# Altium integrated library Integrated_Library1.IntLib: 249 symbols (part 1 of 4) (continued)
## AF 90° WJDG (continued)

## AFC11-S22ICC-00
designator FPC?  (value not drawn)
22P FPC连接器; Manufacturer: JS(钜硕电子); Symbol: AFC11-S22ICC-00_C11074; Add into BOM: yes; Locking Feature: 抽屉式; Pitch: 0.5mm; FFC, FCB Thickness: 0.3mm; Device: AFC11-S22ICC-00; LCSC Part Name: 间距:0.5mm P数:22P 抽屉式 单侧触点/垂直; Supplier Part: C11074; Manufacturer Part: AFC11-S22ICC-00; Supplier Footprint: SMD,P=0.5mm; JLCPCB Part Class: Extended Part; Datasheet: https://atta.szlcsc.com/upload/public/pdf/source/20191211/C466537_F6F2472ADACFFA77E875AFE9DAB8E0AD.pdf; Supplier: LCSC; Convert to PCB: yes; Contact Type: 单侧触点/垂直; Number of Contacts: 22P; Mounting Type: 立贴; Height Above Board: 4.4mm
footprint FPC-SMD_22P-P1.00_AFC11-S22ICC-00
3D model FPC-SMD_22P-P1.00_AFC11-S22ICC-00
pins: 1, 2, 3, 4, 5, 6, 7, 8, 9, 10, 11, 12, 13, 14, 15, 16, 17, 18, 19, 20, 21, 22, 23, 24

## AMS1117-3.3
designator U?
线性稳压芯片; PartNumber: LM1117IDT-3.3; Manufacturer: National Semiconductor; PackageTopMarking: NSUZXYTT*LM1117*IDT-3.3; PowerWise: N; CompType: LDO IC; High-Reliability: Y; DatasheetVersion: Apr-2006; PackageVersion: revD, Feb-2009; PackageReference: TD03B; PackageDescription: TO252, Molded, Jedec, 6.8 x 6.10 x 2.30mm Body, 3 Lead, 2.28mm Pitch, Surface Mount; RoHS: N; PinCount: 3; Code_JEDEC: TO-252-AA; ComponentLink1Description: Manufacturer URL; ComponentLink1URL: http://www.national.com/; ComponentLink2Description: LM1117 Datasheet; ComponentLink2URL: http://www.national.com/ds/LM/LM1117.pdf; ComponentLink3Description: LM1117 Web Page; ComponentLink3URL: http://www.national.com/pf/LM/LM1117.html; ComponentLink4Description: TD03B Package Page; ComponentLink4URL: http://www.national.com/packaging/folders/td03b.html
footprint sot-223
pins: 1 GND (power), 2 OUT (power), 3 IN (power)

## ANT3216LL00R2400A
designator U?  (value not drawn)
2.4GHz天线; Manufacturer: YAGEO(国巨); Add into BOM: yes; Antenna Type: 芯片天线; Central Frequency: 2.45GHz; Bandwidth: 160MHz; Peak Gain: 5.05dBi; Polarization Type: 线性; Impedance: 50Ω; Power capacity: 1W; Symbol: ANT3216LL00R2400A; Device: ANT3216LL00R2400A; LCSC Part Name: 无线组件陶瓷芯片天线; Supplier Part: C293767; Manufacturer Part: ANT3216LL00R2400A; Supplier Footprint: 1206; JLCPCB Part Class: Extended Part; Datasheet: https://atta.szlcsc.com/upload/public/pdf/source/20181012/C293767_CDE82A2F74DC82A94DB708CB53B68F23.pdf; Supplier: LCSC; Convert to PCB: yes; VSWR: -; Operating Temperature: -40℃~+105℃
footprint ANT-SMD_L3.2-W1.6
3D model ANT-SMD_L3.2-W1.6-H1.3
pins: 1, 2

## AON7403
designator U?  (value not drawn)
Manufacturer: TECH PUBLIC(台舟); Symbol: AON7403_C5310961; Add into BOM: yes; Device: AON7403_C5310961; LCSC Part Name: AON7403; Supplier Part: C5310961; Manufacturer Part: AON7403; Supplier Footprint: PDFN-8; JLCPCB Part Class: Extended Part; Datasheet: https://atta.szlcsc.com/upload/public/pdf/source/20221212/36DA98EDFE73327CB4574501A775E746.pdf; Supplier: LCSC; Convert to PCB: yes
footprint DFN-8_L3.0-W3.0-P0.65-BL
pins: D, G, S

## BAT46WJ
designator D?, comment BAT46WJ,115  (value not drawn)
小信号肖特基二极管; Manufacturer: Nexperia(安世); Add into BOM: yes; Forward Voltage (Vf@If): 850mV@250mA; Reverse Voltage (Vr): 100V; Average Rectified Current (Io): 250mA; Reverse Leakage Current (Ir): 9uA@100V; Symbol: BAT46WJ,115; Device: BAT46WJ,115; LCSC Part Name: 电压:100V 电流:250mA; Supplier Part: C114696; Manufacturer Part: BAT46WJ,115; Supplier Footprint: SOD-323F; JLCPCB Part Class: Extended Part; Datasheet: https://atta.szlcsc.com/upload/public/pdf/source/20170620/1497944776306.pdf; Supplier: LCSC; Convert to PCB: yes
footprint SOD-323F_L2.0-W1.6-LS2.5-RD
3D model SOD-323F_L1.6-W1.3-H1.1-LS2.7
pins: 1 K, 2 A

## BC807-25
designator Q?  (value not drawn)
PNP三极管 45V; Manufacturer: Slkor(萨科微); Symbol: BC807-25_C556162; Add into BOM: yes; Transistor Type: PNP; Collector Current (Ic): 500mA; Power Dissipation (Pd): 300mW; DC Current Gain (hFE@Ic,Vce): 160@100mA,1V; Transition Frequency (fT): 100MHz; Collector Cut-Off Current (Icbo): 100nA; Collector-Emitter Saturation Voltage (VCE(sat)@Ic,Ib): 700mV@500mA,50mA; Device: BC807-25_C556162; LCSC Part Name: PNP 电流:500mA 耐压:45V; Supplier Part: C556162; Manufacturer Part: BC807-25; Supplier Footprint: SOT-23; JLCPCB Part Class: Extended Part; Datasheet: https://atta.szlcsc.com/upload/public/pdf/source/20200521/C556162_BDCBBA5B0FE68DCC5A46121101641694.pdf; Supplier: LCSC; Convert to PCB: yes; Collector-Emitter Breakdown Voltage (Vceo): 45V; Operating Temperature: -
footprint SOT-23-3_L2.9-W1.3-P1.90-LS2.4-BR
pins: 1 B, 2 E, 3 C

## BL-M8800DS1
designator U?  (value not drawn)
WIFI6 2.4GHz/5GHz模块; Manufacturer: Ai-Thinker(安信可); Symbol: AI-M62-CBS(BLIFN4); Add into BOM: yes; Device: Ai-M62-CBS(BLIFN4); LCSC Part Name: Ai-M62-CBS(BLIFN4); Supplier Part: C41368035; Manufacturer Part: Ai-M62-CBS(BLIFN4); Supplier Footprint: SMD,12x12mm; JLCPCB Part Class: Extended Part; Datasheet: https://atta.szlcsc.com/upload/public/pdf/source/20240321/D62C7EC8BED5F5764FD8187C205F7E1C.pdf; Supplier: LCSC; Convert to PCB: yes
footprint WIRELM-SMD_AI-M62-CBS
3D model WIRELM-SMD_AI-M62-CBS
pins: 1 GND, 2 WL_BT_ANT, 3 GND, 4 NC, 5 GND, 6 HOST_WAKE_BT, 7 BT_WAKE_HOST, 8 NC, 9 VBAT, 10 USB_DM, 11 USB_DP, 12 WL_PWR, 13 WL_WAKE_HOST, 14 SDIO_DATA_2, 15 SDIO_DATA_3, 16 SDIO_CMD, 17 SDIO_CLK, 18 SDIO_DATA_0, 19 SDIO_DATA_1, 20 GND, 21 NC, 22 VDDIO, 23 GPIO_B4, 24 NC, 25 NC, 26 NC, 27 NC, 28 NC, 29 UART0_TX, 30 UART0_RX, 31 GND, 32 NC, 33 GND, 34 GPIOB7, 35 GPIOB6, 36 GND, 37 NC, 38 NC, 39 NC, 40 NC, 41 UART1_RTS, 42 UART1_TX, 43 UART1_RX, 44 UART1_CTS

## BMI088
designator U5
BMI088 陀螺仪
footprint LGA-16_L4.5-W3.0-P0.50-BL
pins: 1 INT2, 2 NC, 3 VDD, 4 GNDIO, 5 CSB2, 6 GND, 7 PS, 8 SCK, 9 SDI, 10 SDO2, 11 VDDIO, 12 INT3, 13 INT4, 14 CSB1, 15 SDO1, 16 INT1

## BZT52C27S
designator D?  (value not drawn)
Manufacturer: YFW(佑风微); Symbol: BZT52C27S_C5270783; Add into BOM: yes; Diode Configuration: 独立式; Zener Voltage (Nom): 25.1V; Reverse Leakage Current (Ir): 100nA@18.9V; Zener Voltage (Range): 27V~28.9V; Power Dissipation: 200mW; Zener Impedance (Zzt): 80Ω; Device: BZT52C27S_C5270783; LCSC Part Name: BZT52C27S; Supplier Part: C5270783; Manufacturer Part: BZT52C27S; Supplier Footprint: SOD-323; JLCPCB Part Class: Extended Part; Datasheet: https://atta.szlcsc.com/upload/public/pdf/source/20221116/07630275E16F5BD1867C326257346985.pdf; Supplier: LCSC; Convert to PCB: yes
footprint SOD-323_L1.6-W1.3-LS2.7-RD
3D model SOD-323_L1.6-W1.3-LS2.7-RD
pins: 1 C, 2 A

## CD43功率电感
designator L?, comment 10uH  (value not drawn)
功率电感; Manufacturer: MINGSTAR(登壹); Name: 22uH; Symbol: CD43N-220M; Add into BOM: yes; Value: 22uH; Tolerance: ±20%; Rated Current: 930mA; DC Resistance (DCR): 230mΩ; Device: CD43N-220M; LCSC Part Name: 22uH ±20%; Supplier Part: C2832086; Manufacturer Part: CD43N-220M; Supplier Footprint: SMD,4.5x4mm; JLCPCB Part Class: Extended Part; Datasheet: https://atta.szlcsc.com/upload/public/pdf/source/20210524/C2832086_3DE1D5B4C4DE81ED72BC30D5D3934BF5.pdf; Supplier: LCSC; Convert to PCB: yes; Saturation Current (Isat): -; Ratings: -
footprint IND-SMD_L4.5-W4.0
3D model IND-SMD_L4.5-W4.0-H3.2
pins: 1, 2

## CD54功率电感
designator L?, comment 22uH
功率电感; Code_IEC: 1005; Value: 47uH; Published: 8-Jun-2000; LatestRevisionDate: 29-May-2009; LatestRevisionNote: IPC-7351 Footprint Added.; PackageReference: 0402-A; Publisher: Altium Limited; PackageDescription: Chip Inductor; Code_JEITA: 0402
footprint CD54NP
pins: 1, 2

## CD4017BM(LX)
designator U?  (value not drawn)
Manufacturer: LX(灵星芯微); Add into BOM: yes; Logic Type: 十进制计数器; Direction: 向上计数器; Supply Voltage: 3V~15V; Number of Elements: 1; Trigger Type: 上升沿; Reset Style: 异步; Timing mode: 同步; Count Rate: 11MHz; Symbol: CD4017BM(LX); Device: CD4017BM(LX); LCSC Part Name: 计数器/分频器; Supplier Part: C22390236; Manufacturer Part: CD4017BM(LX); Supplier Footprint: SOP-16; JLCPCB Part Class: Extended Part; Datasheet: https://atta.szlcsc.com/upload/public/pdf/source/20240425/31B242B6AF6C26D668B5196FBFBA2015.pdf; Supplier: LCSC; Convert to PCB: yes; Operating Temperature: -40℃~+85℃
footprint SOP-16_L10.0-W3.9-P1.27-LS6.0-BL
3D model SOP-16_L9.9-W3.9-H1.5-LS6.0-P1.27
pins: 1 Q5, 2 Q1, 3 Q0, 4 Q2, 5 Q6, 6 Q7, 7 Q3, 8 VSS, 9 Q8, 10 Q4, 11 Q9, 12 Q5-9#, 13 CP1#, 14 CP0, 15 MR, 16 VDD

## CD4017BM(LX)_1
designator U?, comment CD4017BM(LX)  (value not drawn)
Manufacturer: LX(灵星芯微); Add into BOM: yes; Logic Type: 十进制计数器; Direction: 向上计数器; Supply Voltage: 3V~15V; Number of Elements: 1; Trigger Type: 上升沿; Reset Style: 异步; Timing mode: 同步; Count Rate: 11MHz; Symbol: CD4017BM(LX); Device: CD4017BM(LX); LCSC Part Name: 计数器/分频器; Supplier Part: C22390236; Manufacturer Part: CD4017BM(LX); Supplier Footprint: SOP-16; JLCPCB Part Class: Extended Part; Datasheet: https://atta.szlcsc.com/upload/public/pdf/source/20240425/31B242B6AF6C26D668B5196FBFBA2015.pdf; Supplier: LCSC; Convert to PCB: yes; Operating Temperature: -40℃~+85℃
footprint SOP-16_L10.0-W3.9-P1.27-LS6.0-BL
3D model SOP-16_L9.9-W3.9-H1.5-LS6.0-P1.27
pins: 1 Q5, 2 Q1, 3 Q0, 4 Q2, 5 Q6, 6 Q7, 7 Q3, 8 VSS, 9 Q8, 10 Q4, 11 Q9, 12 Q5-9#, 13 CP1#, 14 CP0, 15 MR, 16 VDD

## CD4017BM(LX)_2
designator U?, comment CD4017BM(LX)  (value not drawn)
Manufacturer: LX(灵星芯微); Add into BOM: yes; Logic Type: 十进制计数器; Direction: 向上计数器; Supply Voltage: 3V~15V; Number of Elements: 1; Trigger Type: 上升沿; Reset Style: 异步; Timing mode: 同步; Count Rate: 11MHz; Symbol: CD4017BM(LX); Device: CD4017BM(LX); LCSC Part Name: 计数器/分频器; Supplier Part: C22390236; Manufacturer Part: CD4017BM(LX); Supplier Footprint: SOP-16; JLCPCB Part Class: Extended Part; Datasheet: https://atta.szlcsc.com/upload/public/pdf/source/20240425/31B242B6AF6C26D668B5196FBFBA2015.pdf; Supplier: LCSC; Convert to PCB: yes; Operating Temperature: -40℃~+85℃
footprint SOP-16_L10.0-W3.9-P1.27-LS6.0-BL
3D model SOP-16_L9.9-W3.9-H1.5-LS6.0-P1.27
pins: 1 Q5, 2 Q1, 3 Q0, 4 Q2, 5 Q6, 6 Q7, 7 Q3, 8 VSS, 9 Q8, 10 Q4, 11 Q9, 12 Q5-9#, 13 CP1#, 14 CP0, 15 MR, 16 VDD

## CD4046BM/TR
designator U?  (value not drawn)
Manufacturer: HGSEMI(华冠); Add into BOM: yes; Symbol: CD4046BM/TR; Device: CD4046BM/TR; LCSC Part Name: CD4046BM/TR; Supplier Part: C7432285; Manufacturer Part: CD4046BM/TR; Supplier Footprint: SOP-16; JLCPCB Part Class: Extended Part; Datasheet: https://atta.szlcsc.com/upload/public/pdf/source/20240403/A740F569B8D8773AFE9FBF7376F8B764.pdf; Supplier: LCSC; Convert to PCB: yes
footprint SOP-16_L9.9-W3.9-P1.27-LS6.0-BL
3D model SOP-16_L9.9-W3.9-P1.27-LS6.0-BL
pins: 1 PCP, 2 PC1, 3 COMP IN, 4 FOUT, 5 EN#, 6 C1, 7 C2, 8 VSS, 9 VCO IN, 10 SF OUT, 11 R1, 12 R2, 13 PC2, 14 SIG IN, 15 ZENER, 16 VDD

## CD4082 (LX)
designator U?
双通道四输入与门
footprint SOP14_N (8.7*6.2*1.8mm（长宽高）)
part A pins: 1, 2, 3, 4, 5, 7 VSS, 14 VCC
part B pins: 9, 10, 11, 12, 13

## CH217K
designator U?
Current-Limited USB Power Distribution Switch
footprint SOT-23-6
pins: 1 VOUT (power), 2 GND (power), 3 FLAG# (oc), 4 EN# (in), 5 ISET (io), 6 VIN (power)

## CH339F
designator U?
4 ports High-Speed USB MTT Hub with SDIO & ethernet
footprint QFN32_4X4
pins: 0 GND (power), 1 MDITP (io), 2 MDITN (io), 3 VDD33 (power), 4 MDIRP (io), 5 MDIRN (io), 6 DMU (io), 7 DPU (io), 8 XO (out), 9 XI (in), 10 AVDDK (power), 11 DM1 (io), 12 DP1 (io), 13 DM2 (io), 14 DP2 (io), 15 VDD33 (power), 16 RESET# (in), 17 OVCUR# (in), 18 PWREN# (out), 19 SD_D3 (io), 20 SD_D2 (io), 21 SD_D1 (io), 22 SD_D0 (io), 23 SD_SCK/CFG1 (io), 24 VSDIO (power), 25 SD_CMD/CFG0 (io), 26 LED_ACT/SDA (io), 27 LED_LINK/SCL (out), 28 DVDDK (power), 29 DM4 (io), 30 DP4 (io), 31 DM3 (io), 32 DP3 (io)
2 alternate drawings of the same symbol

## CH343P
designator U?
USB to high speed enhanced TTL Serial / UART
footprint QFN16_3X3 (Footprint not found)
pins: 0 GND (power), 1 VIO (power), 2 GND (power), 3 VDD5 (power), 4 TXD (out), 5 RXD (in), 6 V3 (power), 7 UD+ (io), 8 UD- (io), 9 VBUS (in), 10 ACT# (out), 11 DCD (in), 12 DTR (out), 13 RTS (out), 14 DSR (in), 15 CTS (in), 16 RI (in)

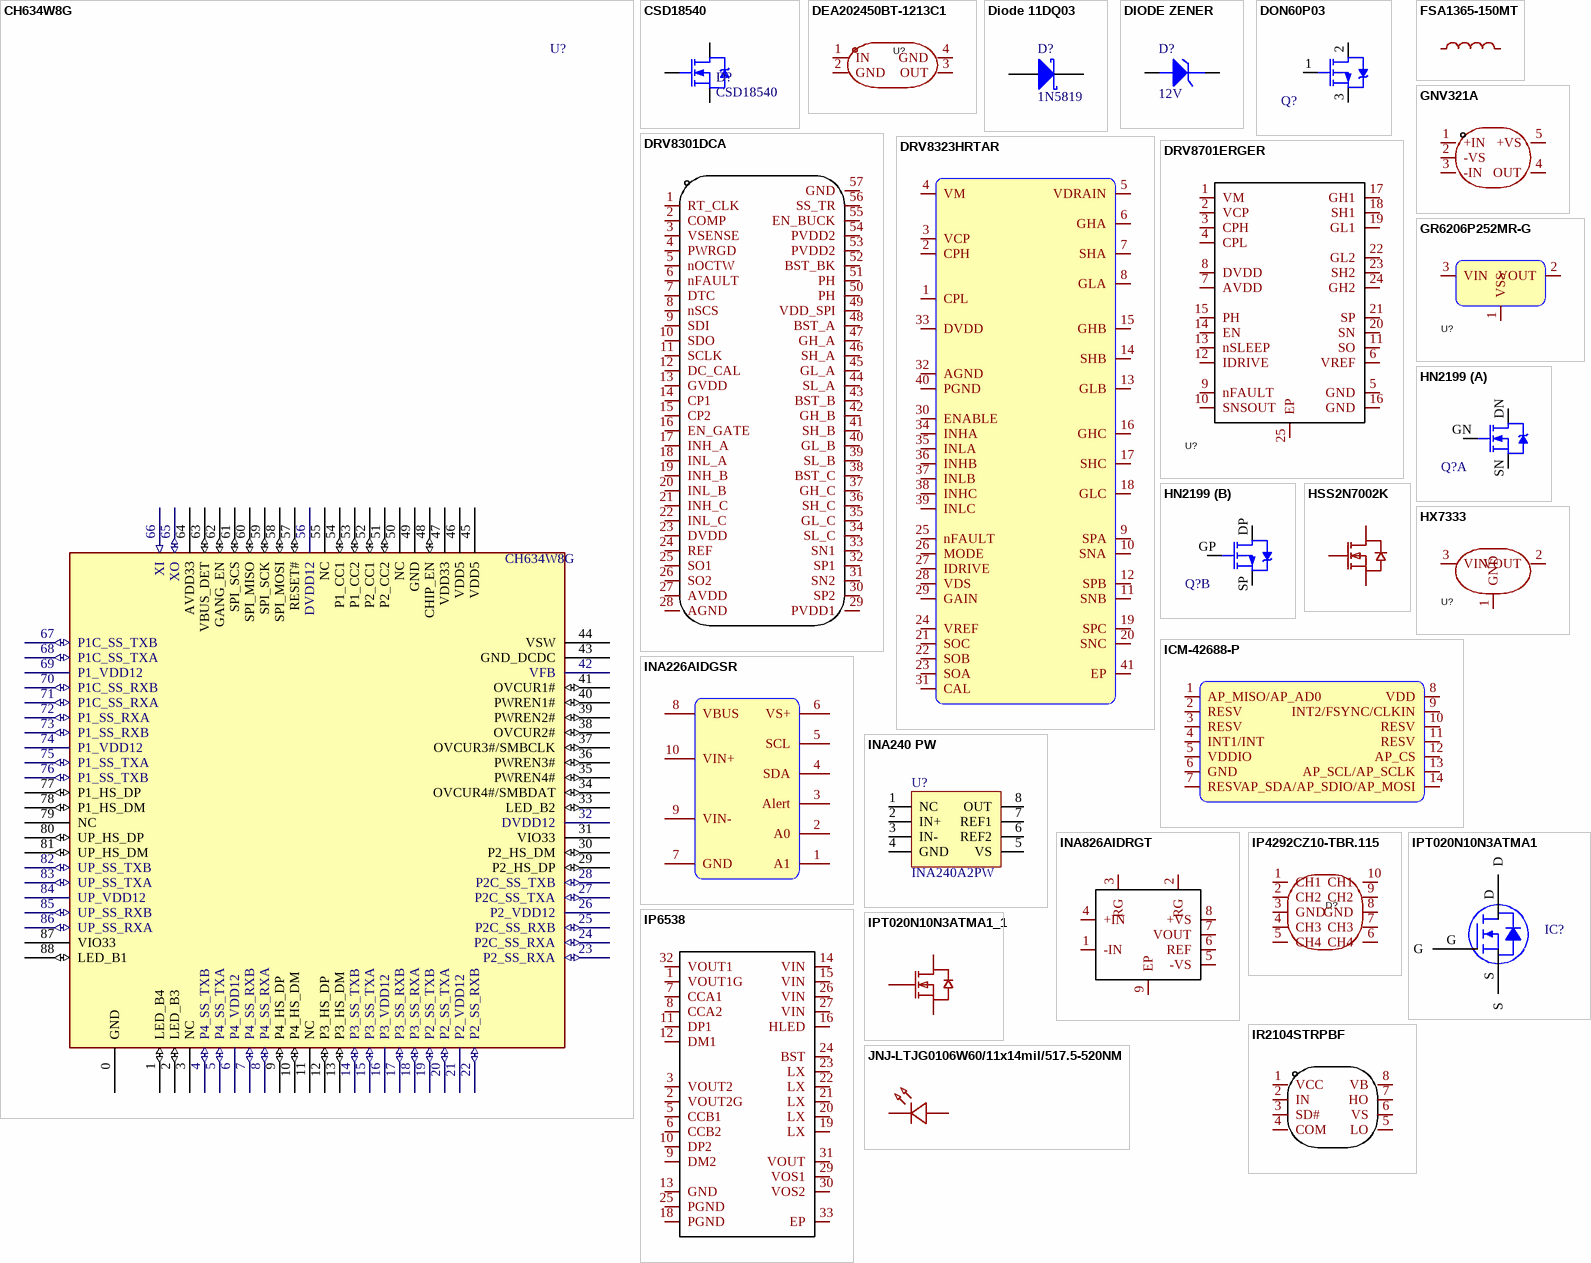
[diagram p2: symbols CH634W8G to JNJ-LTJG0106W60/11x14mil/517.5-520NM]

## CH634W8G
designator U?
4 ports USB 3.0 SS hub
footprint QFN88_10X10
pins: 0 GND (power), 1 LED_B4 (io), 2 LED_B3 (io), 3 NC, 4 P4_SS_TXB (io), 5 P4_SS_TXA (io), 6 P4_VDD12 (power), 7 P4_SS_RXB (io), 8 P4_SS_RXA (io), 9 P4_HS_DP (io), 10 P4_HS_DM (io), 11 NC, 12 P3_HS_DP (io), 13 P3_HS_DM (io), 14 P3_SS_TXB (io), 15 P3_SS_TXA (io), 16 P3_VDD12 (power), 17 P3_SS_RXB (io), 18 P3_SS_RXA (io), 19 P2_SS_TXB (io), 20 P2_SS_TXA (io), 21 P2_VDD12 (power), 22 P2_SS_RXB (io), 23 P2_SS_RXA (io), 24 P2C_SS_RXA (io), 25 P2C_SS_RXB (io), 26 P2_VDD12 (power), 27 P2C_SS_TXA (io), 28 P2C_SS_TXB (io), 29 P2_HS_DP (io), 30 P2_HS_DM (io), 31 VIO33 (power), 32 DVDD12 (power), 33 LED_B2 (io), 34 OVCUR4#/SMBDAT (io), 35 PWREN4# (io), 36 PWREN3# (io), 37 OVCUR3#/SMBCLK (io), 38 OVCUR2# (io), 39 PWREN2# (io), 40 PWREN1# (io), 41 OVCUR1# (io), 42 VFB (power), 43 GND_DCDC (power), 44 VSW (power), 45 VDD5 (power), 46 VDD5 (power), 47 VDD33 (power), 48 CHIP_EN (io), 49 GND (power), 50 NC, 51 P2_CC2 (io), 52 P2_CC1 (io), 53 P1_CC2 (io), 54 P1_CC1 (io), 55 NC, 56 DVDD12 (power), 57 RESET# (io), 58 SPI_MOSI (io), 59 SPI_SCK (io), 60 SPI_MISO (io), 61 SPI_SCS (io), 62 GANG_EN (io), 63 VBUS_DET (io), 64 AVDD33 (power), 65 XO (io), 66 XI (in), 67 P1C_SS_TXB (io), 68 P1C_SS_TXA (io), 69 P1_VDD12 (power), 70 P1C_SS_RXB (io), 71 P1C_SS_RXA (io), 72 P1_SS_RXA (io), 73 P1_SS_RXB (io), 74 P1_VDD12 (power), 75 P1_SS_TXA (io), 76 P1_SS_TXB (io), 77 P1_HS_DP (io), 78 P1_HS_DM (io), 79 NC, 80 UP_HS_DP (io), 81 UP_HS_DM (io), 82 UP_SS_TXB (io), 83 UP_SS_TXA (io), 84 UP_VDD12 (power), 85 UP_SS_RXB (io), 86 UP_SS_RXA (io), 87 VIO33 (power), 88 LED_B1 (io)

## CSD18540
designator D?
N沟道MOS管; Note: Pin 2 is electrically connected to pin 4.; Published: 8-Jun-2000; LatestRevisionDate: 17-Jul-2002; LatestRevisionNote: Re-released for DXP Platform.; DatasheetVersion: PD-9.814; PackageVersion: Feb-1997; PackageReference: TO-220AB; Publisher: Altium Limited; PackageDescription: TO, Thru-Hole, Vertical, Heatsink Mounted; 3 In-Line Leads; Pitch 2.54 mm; ComponentLink1Description: Manufacturer Link; ComponentLink1URL: http://www.irf.com/
footprint pg-tdson-8
pins: 1 G, 2 D, 3 S

## DEA202450BT-1213C1
designator U?  (value not drawn)
RF滤波器,中心频率2.45GHz,带宽100MHz; Manufacturer: TDK; Add into BOM: yes; Bandwidth: 100MHz; Filter Type: 带通; Insertion Loss: 1.5dB; Symbol: DEA202450BT-1213C1; Device: DEA202450BT-1213C1; LCSC Part Name: 多层带通滤波器; Supplier Part: C307898; Manufacturer Part: DEA202450BT-1213C1; Supplier Footprint: SMD-4P,1.2x2mm; JLCPCB Part Class: Extended Part; Datasheet: https://atta.szlcsc.com/upload/public/pdf/source/20181022/C307898_ED335916B8BBF018B2A2B9FCE924371D.pdf; Supplier: LCSC; Convert to PCB: yes; Ripple: -; Operating Temperature: -40℃~+85℃
footprint FILTER-SMD_0805-4P-L2.0-W1.3-L
3D model FILTER-SMD_0805-4P-L2.0-W1.3-H1.0-L
pins: 1 IN, 2 GND, 3 OUT, 4 GND

## Diode 11DQ03
designator D?, comment 1N5819
TVS; ComponentLink1Description: Manufacturer Link; ComponentLink1URL: http://www.irf.com/; ComponentLink2Description: Datasheet; ComponentLink2URL: http://www.irf.com/product-info/datasheets/data/11dq03.pdf
footprint SMA; pin to pad A>1 K>2
pins: 1 A, 2 K

## DIODE ZENER
designator D?, comment 12V
稳压二极管
footprint SOD-123; pin to pad A>1 K>2
pins: A, K

## DON60P03
designator Q?  (value not drawn)
PMOS 30V 60A
footprint PG-TDSON-8
pins: 1, 2, 3

## DRV8301DCA
designator U?  (value not drawn)
三相电机驱动器; Manufacturer: TI(德州仪器); Add into BOM: yes; Symbol: DRV8301DCA; Device: DRV8301DCA; Supplier: LCSC; Supplier Part: C92113; Manufacturer Part: DRV8301DCA; JLCPCB Part Class: Extended Part; LCSC Part Name: DRV8301DCA; Supplier Footprint: HTSSOP-56-EP-6mm; Datasheet: https://www.ti.com/cn/lit/gpn/drv8301; Convert to PCB: yes
footprint HTSSOP-56_L14.0-W6.0-P0.50-LS8.1-BL-EP
pins: 1 RT_CLK, 2 COMP, 3 VSENSE, 4 PWRGD, 5 nOCTW, 6 nFAULT, 7 DTC, 8 nSCS, 9 SDI, 10 SDO, 11 SCLK, 12 DC_CAL, 13 GVDD, 14 CP1, 15 CP2, 16 EN_GATE, 17 INH_A, 18 INL_A, 19 INH_B, 20 INL_B, 21 INH_C, 22 INL_C, 23 DVDD, 24 REF, 25 SO1, 26 SO2, 27 AVDD, 28 AGND, 29 PVDD1, 30 SP2, 31 SN2, 32 SP1, 33 SN1, 34 SL_C, 35 GL_C, 36 SH_C, 37 GH_C, 38 BST_C, 39 SL_B, 40 GL_B, 41 SH_B, 42 GH_B, 43 BST_B, 44 SL_A, 45 GL_A, 46 SH_A, 47 GH_A, 48 BST_A, 49 VDD_SPI, 50 PH, 51 PH, 52 BST_BK, 53 PVDD2, 54 PVDD2, 55 EN_BUCK, 56 SS_TR, 57 GND

## DRV8323HRTAR
designator U?  (value not drawn)
Manufacturer: TI(德州仪器); Add into BOM: yes; Symbol: DRV8323HRTAR; Device: DRV8323HRTAR; LCSC Part Name: 5mA 无刷直流BLDC电机驱动芯片 60V; Supplier Part: C701783; Manufacturer Part: DRV8323HRTAR; Supplier Footprint: QFN-40-EP(6x6); JLCPCB Part Class: Extended Part; Datasheet: https://www.ti.com/cn/lit/gpn/drv8323; Supplier: LCSC; Convert to PCB: yes
footprint QFN-40_L6.0-W6.0-P0.50-BL-EP4.5
3D model QFN-40_L6.0-W6.0-H0.8-P0.50
pins: 1 CPL, 2 CPH, 3 VCP, 4 VM, 5 VDRAIN, 6 GHA, 7 SHA, 8 GLA, 9 SPA, 10 SNA, 11 SNB, 12 SPB, 13 GLB, 14 SHB, 15 GHB, 16 GHC, 17 SHC, 18 GLC, 19 SPC, 20 SNC, 21 SOC, 22 SOB, 23 SOA, 24 VREF, 25 nFAULT, 26 MODE, 27 IDRIVE, 28 VDS, 29 GAIN, 30 ENABLE, 31 CAL, 32 AGND, 33 DVDD, 34 INHA, 35 INLA, 36 INHB, 37 INLB, 38 INHC, 39 INLC, 40 PGND, 41 EP

## DRV8701ERGER
designator U?  (value not drawn)
Manufacturer: TI(德州仪器); Add into BOM: yes; Symbol: DRV8701ERGER; Device: DRV8701ERGER; LCSC Part Name: 有刷直流电机驱动芯片 45V; Supplier Part: C90964; Manufacturer Part: DRV8701ERGER; Supplier Footprint: VQFN-24-EP(4x4); JLCPCB Part Class: Extended Part; Datasheet: https://www.ti.com/cn/lit/gpn/drv8701; Supplier: LCSC; Convert to PCB: yes
footprint VQFN-24_L4.0-W4.0-P0.50-TL-EP2.5
pins: 1 VM, 2 VCP, 3 CPH, 4 CPL, 5 GND, 6 VREF, 7 AVDD, 8 DVDD, 9 nFAULT, 10 SNSOUT, 11 SO, 12 IDRIVE, 13 nSLEEP, 14 EN, 15 PH, 16 GND, 17 GH1, 18 SH1, 19 GL1, 20 SN, 21 SP, 22 GL2, 23 SH2, 24 GH2, 25 EP

## FSA1365-150MT
designator L?, comment 15uH  (value not drawn)
Manufacturer: Magnetsyc(元磁); Symbol: FSA1365-150MT; Add into BOM: yes; Tolerance: ±20%; Current Rating: 9.5A; Current - Saturation(Isat): 11A; DC Resistance(DCR): 26mΩ; Type: 一体成型电感; Device: FSA1365-150MT; LCSC Part Name: FSA1365-150MT; Supplier Part: C41384379; Manufacturer Part: FSA1365-150MT; Supplier Footprint: SMD,13.5x12.6mm; Datasheet: https://atta.szlcsc.com/upload/public/pdf/source/20240711/9B03E5065F7E305B3C101DF3C90F5A28.pdf; Supplier: LCSC; Convert to PCB: yes; Value: 15uH
footprint IND-SMD_L13.8-W12.7
3D model IND-SMD_L13.8-W12.7
pins: 1, 2

## GNV321A
designator U?  (value not drawn)
Manufacturer: GN(旌芯半导体); Add into BOM: yes; Number of Channels: 单路; Maximum Power Supply Range (Vdd-Vss): 5.5V; Rail to Rail: 轨到轨输入,轨到轨输出; Gain Bandwidth Product: 1.1MHz; Vos - Input Offset Voltage: 1.5mV; Input Offset Voltage Drift(Vos TC): 2.7uV/℃; Slew Rate: 500V/ms; Noise density(eN): 20nV/√Hz@10kHz; Common Mode Rejection Ratio(CMRR): 70dB; Symbol: GNV321A; Device: GNV321A; LCSC Part Name: 单路低功耗运算放大器; Supplier Part: C22461433; Manufacturer Part: GNV321A; Supplier Footprint: SOT-23-5; JLCPCB Part Class: Extended Part; Datasheet: https://atta.szlcsc.com/upload/public/pdf/source/20240605/13659089AF980DB40762016B243D645A.pdf; Supplier: LCSC; Convert to PCB: yes; Operating Temperature: -40℃~+85℃
footprint SOT-23-5_L3.0-W1.7-P0.95-LS2.8-BR
pins: 1 +IN, 2 -VS, 3 -IN, 4 OUT, 5 +VS

## GR6206P252MR-G
designator U?  (value not drawn)
1.8V LDO,100mA; Manufacturer: GR(国睿); Add into BOM: yes; Output Type: 固定; Maximum Input Voltage: 6.5V; Output Voltage: 2.5V; Output Current: 300mA; standby current: 6.5uA; Number of Outputs: 1; Symbol: GR6206P252MR-G; Device: GR6206P252MR-G; LCSC Part Name: GR6206P252MR-G; Supplier Part: C19631733; Manufacturer Part: GR6206P252MR-G; Supplier Footprint: SOT-23-3; JLCPCB Part Class: Extended Part; Datasheet: https://atta.szlcsc.com/upload/public/pdf/source/20231222/0B414D75AEC2848EE9DFF2A875D3E7D2.pdf; Supplier: LCSC; Convert to PCB: yes; Feature: 短路保护；过流保护(OCP)；带使能
footprint SOT-23-3_L2.9-W1.6-P1.90-LS2.8-BR
3D model SOT-23-3L_L2.9-W1.6-H1.1-LS2.8-P0.95
pins: 1 VSS, 2 VOUT, 3 VIN

## HN2199
designator Q?  (value not drawn)
一个NMOS+一个PMOS
footprint DFN-8_L5.8-W4.9-P1.27-LS6.0-BL
part A pins: DN D, GN, SN S
part B pins: DP D, GP G, SP

## HSS2N7002K
designator Q?  (value not drawn)
Manufacturer: HUASHUO(华朔); Add into BOM: yes; Type: 1个N沟道; Drain to Source Voltage: 60V; Current - Continuous Drain(Id): 300mA; RDS(on): 2Ω@4.5V,100mA; Pd - Power Dissipation: 350mW; Gate Threshold Voltage (Vgs(th)@Id): 1.2V; Gate Charge(Qg): 1nC@4.5V; Input Capacitance(Ciss@Vds): 38pF@25V; Reverse Transfer Capacitance (Crss@Vds): 2pF@25V; Symbol: HSS2N7002K; Device: HSS2N7002K; LCSC Part Name: 1个N沟道 耐压:60V 电流:300mA; Supplier Part: C518788; Manufacturer Part: HSS2N7002K; Supplier Footprint: SOT-23-3; JLCPCB Part Class: Extended Part; Datasheet: https://atta.szlcsc.com/upload/public/pdf/source/20200421/C518788_C4C427C6EC2B9797F477B23308332542.pdf; Supplier: LCSC; Convert to PCB: yes; Operating Temperature: -40℃~+150℃
footprint SOT-23-3_L2.9-W1.3-P1.90-LS2.4-BR
3D model SOT-23-3P_L2.9-W1.3-H1.0-LS2.4-P0.95
pins: 1 G, 2 S, 3 D

## HX7333
designator U?  (value not drawn)
3.3V LDO; Manufacturer: HX(恒佳兴); Symbol: HX7333_C296168; Add into BOM: yes; Device: HX7333; LCSC Part Name: 三端稳压IC  HX7333; Supplier Part: C296168; Manufacturer Part: HX7333; Supplier Footprint: SOT-23-3; JLCPCB Part Class: Extended Part; Datasheet: https://atta.szlcsc.com/upload/public/pdf/source/20181113/C296175_579A2FCEE9AC415DE285B8AF619B4CF6.pdf; Supplier: LCSC; Convert to PCB: yes; Output Type: -
footprint SOT-23-3_L2.9-W1.3-P1.90-LS2.4-BR
pins: 1 GND, 2 VOUT, 3 VIN

## ICM-42688-P
designator U?  (value not drawn)
Manufacturer: TDK InvenSense(应美盛); Add into BOM: yes; Sensor Type: 加速度计陀螺仪; Symbol: ICM-42688-P; Device: ICM-42688-P; LCSC Part Name: ICM-42688-P; Supplier Part: C1850418; Manufacturer Part: ICM-42688-P; Supplier Footprint: LGA-14(2.5x3); JLCPCB Part Class: Extended Part; Datasheet: https://atta.szlcsc.com/upload/public/pdf/source/20210703/CF24204867ACE5B754A2B035F23E5931.pdf; Supplier: LCSC; Convert to PCB: yes
footprint LGA-14_L3.0-W2.5-P0.50-TL
3D model LGA-14_L2.5-W3.0-H0.9-P0.50
pins: 1 AP_MISO/AP_AD0, 2 RESV, 3 RESV, 4 INT1/INT, 5 VDDIO, 6 GND, 7 RESV, 8 VDD, 9 INT2/FSYNC/CLKIN, 10 RESV, 11 RESV, 12 AP_CS, 13 AP_SCL/AP_SCLK, 14 AP_SDA/AP_SDIO/AP_MOSI

## INA226AIDGSR
designator U?  (value not drawn)
双向电流传感器; Manufacturer: TI(德州仪器); Add into BOM: yes; Supply Voltage: 0V~36V; Symbol: INA226AIDGSR; Device: INA226AIDGSR; Supplier: LCSC; Manufacturer Part: INA226AIDGSR; Supplier Part: C49851; JLCPCB Part Class: Extended Part; LCSC Part Name: INA226AIDGSR; Supplier Footprint: MSOP-10; Datasheet: https://www.ti.com/cn/lit/gpn/ina226; Convert to PCB: yes; Operating Temperature: -40℃~+125℃
footprint MSOP-10_L3.0-W3.0-P0.50-LS5.0-BL
pins: 1 A1, 2 A0, 3 Alert, 4 SDA, 5 SCL, 6 VS+, 7 GND, 8 VBUS, 9 VIN-, 10 VIN+

## INA240 PW
designator U?, comment INA240A2PW
双向电流传感器
footprint SSOP8 (SSOP, Plastic; 8 Leads; Body Width 5.3 mm; Pitch 0.65 mm)
pins: 1 NC, 2 IN+, 3 IN-, 4 GND, 5 VS, 6 REF2, 7 REF1, 8 OUT

## INA826AIDRGT
designator U?  (value not drawn)
Manufacturer: TI(德州仪器); Add into BOM: yes; Number of Circuits: 单路; Current - Input Bias(Ib): 35nA; Voltage - Input Offset(Vos): 40uV; Slew Rate(SR): 1V/us; -3db Bandwidth: 1MHz; Symbol: INA826AIDRGT; Device: INA826AIDRGT; LCSC Part Name: INA826AIDRGT; Supplier Part: C206201; Manufacturer Part: INA826AIDRGT; Supplier Footprint: SON-8-EP(3x3); JLCPCB Part Class: Extended Part; Datasheet: https://www.ti.com/cn/lit/gpn/ina826; Supplier: LCSC; Convert to PCB: yes; Gain Bandwidth Product(GBP): -; Rail to Rail: -; Output Type: -; Operating Temperature: -40℃~+125℃
footprint SON-8_L3.0-W3.0-P0.50-TL-EP_OPA1612AIDRGR
pins: 1 -IN, 2 RG, 3 RG, 4 +IN, 5 -VS, 6 REF, 7 VOUT, 8 +VS, 9 EP

## IP4292CZ10-TBR.115
designator D?  (value not drawn)
4通道TVS，3.3V; Manufacturer: ElecSuper(静芯微); Add into BOM: yes; polarity: 单向; Reverse Stand-Off Voltage (Vrwm): 3.3V; Maximum Clamping Voltage: 5V; Peak Pulse Current (Ipp): 8A; Peak Pulse Power Dissipation (Ppp): 40W; Reverse Leakage Current (Ir): 100nA; Number of Lines: 四路; Type: ESD; Symbol: IP4292CZ10-TBR.115; Device: IP4292CZ10-TBR.115; LCSC Part Name: ESD/TVS 静电防护二极管; Supplier Part: C39832202; Manufacturer Part: IP4292CZ10-TBR.115; Supplier Footprint: DFN2510-10L; JLCPCB Part Class: Extended Part; Datasheet: https://atta.szlcsc.com/upload/public/pdf/source/20240807/15E28ED9AFBC6FFDA2C5CF98CAC988DA.pdf; Supplier: LCSC; Convert to PCB: yes
footprint DFN2510A-10_L2.5-W1.0-P0.50-BL
3D model DFN2510A-10_L2.5-W1.0-H0.5-P0.50-BL
pins: 1 CH1, 2 CH2, 3 GND, 4 CH3, 5 CH4, 6 CH4, 7 CH3, 8 GND, 9 CH2, 10 CH1

## IP6538
designator U?  (value not drawn)
Manufacturer: INJOINIC(英集芯); Add into BOM: yes; Symbol: IP6538; Device: IP6538; LCSC Part Name: IP6538; Supplier Part: C515679; Manufacturer Part: IP6538; Supplier Footprint: QFN-32-EP(5x5); JLCPCB Part Class: Extended Part; Datasheet: https://atta.szlcsc.com/upload/public/pdf/source/20200610/C515679_FB79CA4FD1661A0547DF6276FB7EE412.pdf; Supplier: LCSC; Convert to PCB: yes
footprint QFN-32_L5.0-W5.0-P0.50-BL-EP3.7
3D model QFN-32_L5.0-W5.0-H0.8-P0.50-BL-EP3.7
pins: 1 VOUT1G, 2 VOUT2G, 3 VOUT2, 5 CCB1, 6 CCB2, 7 CCA1, 8 CCA2, 9 DM2, 10 DP2, 11 DP1, 12 DM1, 13 GND, 14 VIN, 15 VIN, 16 HLED, 18 PGND, 19 LX, 20 LX, 21 LX, 22 LX, 23 LX, 24 BST, 25 PGND, 26 VIN, 27 VIN, 29 VOS1, 30 VOS2, 31 VOUT, 32 VOUT1, 33 EP

## IPT020N10N3ATMA1
designator IC?  (value not drawn)
N沟道MOSFET N-CH 100V 300A 8HSOF; Manufacturer: Infineon Technologies; Rds On (Max) at Id, Vgs: 2 mOhm @ 150A, 10V; Vgs(th) (Max) at Id: 3.5V @ 272uA; Gate Charge (Qg): 156nC @ 10V; Input Capacitance (Ciss) at Vds: 11200pF @ 50V; Power - Max: 375W; Current Continuous Drain: 300A (Tc); Part Number: IPT020N10N3ATMA1; PartId: 7970; Supplier 1: Digi-Key; Supplier Part Number 1: IPT020N10N3ATMA1TR-ND; ComponentLink1Description: Datasheet; ComponentLink1URL: http://www.infineon.com/dgdl/IPT020N10N3_Rev1.1.pdf?folderId=db3a304313b8b5a60113cee8763b02d7&fileId=db3a30433e9d5d11013e9e58035b0158; ComponentLink2Description: Digi-Key Listing; ComponentLink2URL: http://www.digikey.com/product-detail/en/IPT020N10N3ATMA1/IPT020N10N3ATMA1TR-ND/4571872; Price: 3.3442; Type: MOSFET N-Channel, Metal Oxide; Device Package: 8-PowerSFN; Drain to Source Voltage (Vdss): 100V; Features: Standard
footprint INFINEON PG-HSOF-8-1
pins: D, G, S

## IPT020N10N3ATMA1_1
designator Q?, comment IPT020N10N3ATMA1  (value not drawn)
Manufacturer: Infineon(英飞凌); Add into BOM: yes; Type: 1个N沟道; Drain Source Voltage (Vdss): 100V; Continuous Drain Current (Id): 300A; Drain Source On Resistance (RDS(on)@Vgs,Id): 2mΩ@10V,150A; Power Dissipation (Pd): 375W; Gate Threshold Voltage (Vgs(th)@Id): 3.5V@272uA; Total Gate Charge (Qg@Vgs): 207nC@10V; Input Capacitance (Ciss@Vds): 14.896nF@50V; Reverse Transfer Capacitance (Crss@Vds): 138pF@50V; Symbol: IPT020N10N3ATMA1; Device: IPT020N10N3ATMA1; LCSC Part Name: 1个N沟道 耐压:100V 电流:300A; Supplier Part: C6062371; Manufacturer Part: IPT020N10N3ATMA1; Supplier Footprint: HSOF-8; JLCPCB Part Class: Extended Part; Datasheet: https://atta.szlcsc.com/upload/public/pdf/source/20200522/C531201_F3EF8EA3E06D36D9999157C58619309F.pdf; Supplier: LCSC; Convert to PCB: yes; Operating Temperature: -55℃~+175℃
footprint PG-HSOF-8-1_L10.4-W9.9-P1.2-LS11.7-TL
3D model PG-HSOF-8-1_L10.4-W9.9-H2.3-P1.2-LS11.7-TL
pins: 1 G, 2 S, 3 D
